# Altium footprint library Altium_Lib.PcbLib: 334 footprints (part 1 of 21)
Each footprint in its own frame and in the unit in brackets; x right, y up, seen from the top. Pads: shape width x height; smd on the part's side, far side on the other; paste and mask are expansions set on the pad; w line width, h text height; cw(c..) or ccw(c..) is an arc to the next point about the centre after c.
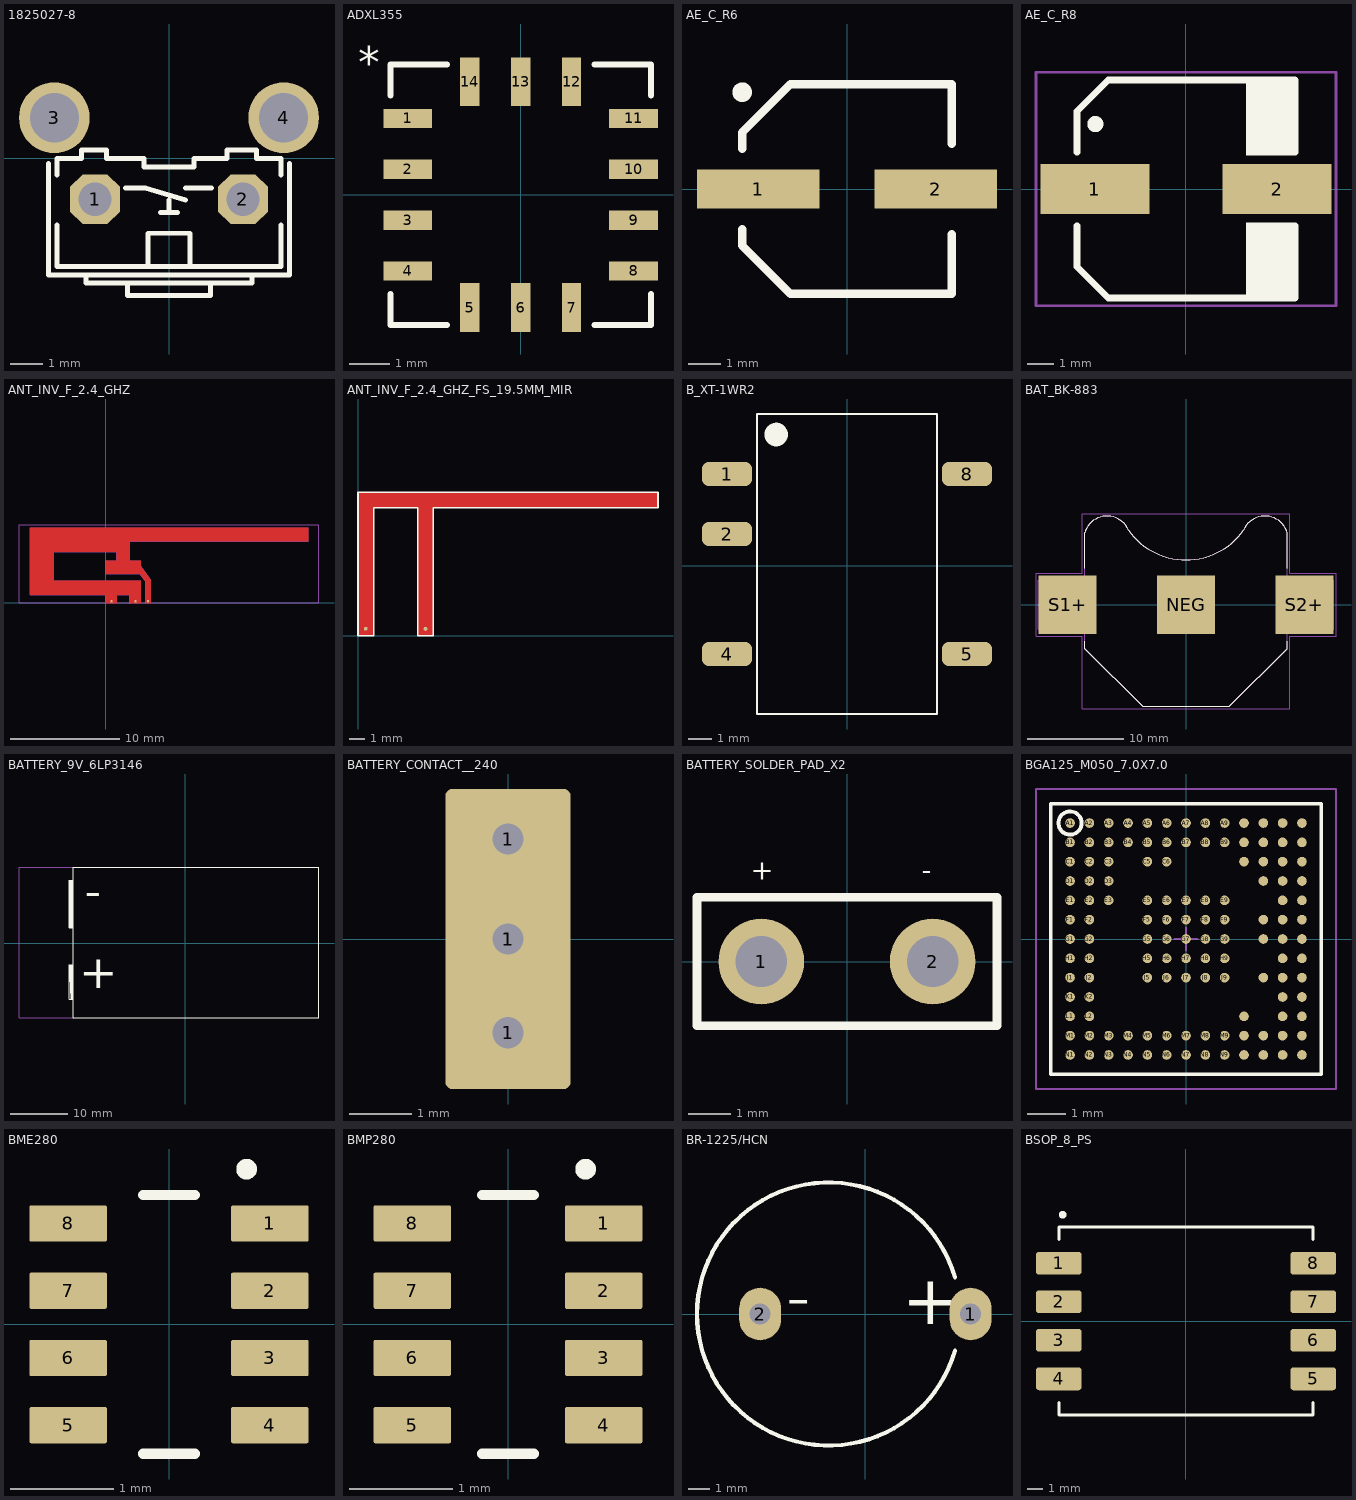
[diagram p0: the footprints below, top view; thin cyan lines are the x and y axes]

## 1825027-8 [mil] "B3F-31XX"
pads (4):
  oct 60x60 hole 40: 1(-89,-49.02) 2(89,-49.02)
  round 85 hole 59: 3(-138,49) 4(138,49)
Top Overlay:
  lines w6: -145,-5.91 -145,-140 100,-140 ; -135,-80 -135,-130 -25,-130 ; -135,-20 -135,0 -105,0 -105,10 -75,10 -75,0 -30,0 -30,-10 30,-10 30,0 70,0 70,10 105,10 105,0 135,0 135,-20 ; -100,-140 -100,-150 -50,-150 ; -52.17,-35.43 -28.54,-35.43 20,-50 ; -10,-65 0,-65 ; 0,-50 0,-65 ; 10,-65 0,-65 ; 19.68,-35.43 51.18,-35.43 ; 135,-80 135,-130 25,-130 ; 145,-5.91 145,-140 100,-140 ; -50,-150 -50,-165 50,-165 50,-150 ; -50,-150 50,-150 ; -25,-130 -25,-90 25,-90 25,-130 ; -25,-130 25,-130 ; 50,-150 100,-150 100,-140
3D body "c-1825027-8-g-3d.stp": height 314.85, standoff -99.15, extent -161.56,-278.59 169.44,108.91

## ADXL355 [mil]
pads (14):
  rect 48x19 smd: 1(-111,75) 2(-111,25) 3(-111,-25) 4(-111,-75) 8(111,-75) 9(111,-25) 10(111,25) 11(111,75)
  rect 19x48 smd: 5(-50,-111) 6(0,-111) 7(50,-111) 12(50,111) 13(0,111) 14(-50,111)
Top Overlay:
  lines w6: -128,-97.6 -128,-128 -72.6,-128 ; -128,97.6 -128,128 -72.6,128 ; 72.6,-128 128,-128 128,-97.6 ; 72.6,128 128,128 128,97.6
  text "*" at -160,115 h31.25

## AE_C_R6 [mm]
pads (2):
  rect 3.8x1.2 smd: 1(-2.75,0) 2(2.75,0)
Top Overlay:
  circle w0.305: c-3.25,3 r0.152
  lines w0.254: -3.25,-1.25 -3.25,-1.75 -1.75,-3.25 3.25,-3.25 3.25,-1.4 ; -3.25,1.25 -3.25,1.75 -1.75,3.25 3.25,3.25 3.25,1.4
3D body "User Library-SMD Polymer Aluminum Electrolytic Capacitors C6.STEP": height 5.9, standoff -0.05, extent -3.65,-3.3 3.65,3.3

## AE_C_R8 [mm]
height 10
pads (2):
  rect 4.15x1.9 smd: 1(-3.475,0) 2(3.475,0)
Top Overlay:
  circle w0.305: c-3.452,2.475 r0.152
  rectangle: 2.286,1.27 4.191,4.166
  rectangle: 2.286,-4.115 4.14,-1.27
  lines w0.254: -4.15,-1.4 -4.15,-2.962 -2.962,-4.15 4.15,-4.15 4.15,-1.4 ; -4.15,1.4 -4.15,2.962 -2.962,4.15 4.15,4.15 4.15,1.4
Mechanical 15:
  lines w0.1: -5.715,-4.445 5.715,-4.445 5.715,4.445 -5.715,4.445 -5.715,-4.445
3D body "AE_C_R8_01.STEP": height 10.2, standoff 0, extent -4.95,-4.15 4.95,4.15

## ANT_INV_F_2.4_GHZ [mm]
pads (3):
  rrect10% 0.2x0.2 smd mask+0.05: 1(3.875,0.15) 2(2.725,0.15) 3(0.525,0.15)
Top Layer:
  region: -6.98,0.735 -0.005,0.735 -0.005,0 -0.005,-0.001 -0.004,-0.003 -0.003,-0.004 -0.001,-0.005 0,-0.005 1,-0.005 1.001,-0.005 1.003,-0.004 1.005,-0.003 1.006,-0.001 1.006,0 1.006,0.735 2.195,0.735 2.195,0 2.195,-0.001 2.196,-0.003 2.197,-0.004 2.199,-0.005 2.2,-0.005 3.2,-0.005 3.201,-0.005 3.203,-0.004 3.205,-0.003 3.206,-0.001 3.206,0 3.206,2.03 3.206,2.031 3.205,2.033 3.203,2.035 3.201,2.036 3.2,2.036 -4.794,2.036 -4.794,4.695 0.995,4.695 0.995,3.906 0,3.906 -0.001,3.906 -0.003,3.905 -0.004,3.903 -0.005,3.901 -0.005,3.9 -0.005,2.69 -0.005,2.689 -0.004,2.687 -0.003,2.686 -0.001,2.685 0,2.685 3.126,2.685 3.645,1.934 3.645,0 3.645,-0.001 3.646,-0.003 3.647,-0.004 3.649,-0.005 3.65,-0.005 4.11,-0.005 4.111,-0.005 4.113,-0.004 4.115,-0.003 4.116,-0.001 4.116,0 4.116,2.078 4.116,2.079 4.115,2.079 4.115,2.08 4.115,2.081 3.206,3.4 3.206,3.9 3.206,3.901 3.205,3.903 3.203,3.905 3.201,3.906 3.2,3.906 2.206,3.906 2.206,5.695 18.6,5.695 18.601,5.695 18.603,5.696 18.605,5.697 18.606,5.699 18.606,5.7 18.606,6.91 18.606,6.911 18.605,6.913 18.603,6.915 18.601,6.916 18.6,6.916 -6.98,6.916 -6.981,6.916 -6.983,6.915 -6.984,6.913 -6.985,6.911 -6.985,6.91 -6.985,0.74 -6.985,0.739 -6.984,0.737 -6.983,0.736 -6.981,0.735
Mechanical 2:
  lines w0.01: 0,0 1,0 ; 0,0 1,0 ; 0,0 0,0.74 -6.98,0.74 -6.98,6.91 18.6,6.91 18.6,5.7 2.2,5.7 2.2,3.9 3.2,3.9 3.2,3.398 4.11,2.078 4.11,0 ; 0,0 1,0 ; 1,0 1,0.74 2.2,0.74 2.2,0 ; 2.2,0 3.2,0 ; 2.2,0 3.2,0 ; 2.2,0 3.2,0 ; 3.2,0 3.2,2.03 -4.8,2.03 -4.8,4.7 1,4.7 1,3.9 0,3.9 0,2.69 3.129,2.69 3.65,1.935 3.65,0 ; 3.65,0 4.11,0 ; 3.65,0 4.11,0 ; 3.65,0 4.11,0
Mechanical 31:
  lines w0.05: -8,0 -7,0 18.6,0 19.6,0 19.6,7.175 -8,7.175 -8,0

## ANT_INV_F_2.4_GHZ_FS_19.5MM_MIR [mil] "F-ANTENNA INVERSE 19.5 mm"
pads (2):
  round 10 smd paste-10 mask-10: 1(172.68,17.72) 2(19.68,17.85)
Top Layer:
  region: 0,367.2 767.72,367.2 767.72,327.07 193,327.07 193,0 153,0 153,327.07 40,327.07 40,0 20,0 0,0
Top Overlay:
  lines w3.94: 0,0.13 40,0.13 40,327.13 153,327.13 153,0.13 193,0.13 193,327.13 767.72,327.13 767.72,367.13 0,367.13 0,0.13

## B_XT-1WR2 [mm]
pads (5):
  rrect50% 2.1x1 smd: 1(-5.08,3.88) 2(-5.08,1.34) 4(-5.08,-3.74) 5(5.08,-3.74) 8(5.08,3.88)
Top Overlay:
  circle w0.5: c-3,5.55 r0.25
  lines w0.1: -3.81,-6.28 -3.81,6.42 3.81,6.42 3.81,-6.28 -3.81,-6.28
3D body "User Library-B_XT-1WR2.STEP": height 7.45, standoff 0.2, extent -5.6,-6.25 5.6,6.45

## BAT_BK-883 [mm]
pads (3):
  rect 6.07x6.07 smd paste-4: NEG(0,0)
  rect 6.07x6.07 smd: S1+(-12.33,0) S2+(12.33,0)
Top Overlay:
  lines w0.127: -10.561,7.48 cw(c-8.222,6.81) -6,7.799 ; -10.555,-3.81 -10.555,-4.58 -4.5,-10.57 4.5,-10.57 10.555,-4.58 10.555,-3.81 ; -10.555,3.81 -10.555,7.5 ; -6,7.8 ccw(c0,12.001) 6,7.8 ; 6,7.799 cw(c8.222,6.81) 10.561,7.48 ; 10.555,3.81 10.555,7.5
Mechanical 13:
  lines w0.127: -10.561,7.48 cw(c-8.222,6.81) -6,7.799 ; -10.555,7.5 -10.555,2.54 -15.365,2.54 -15.365,-2.54 -10.555,-2.54 -10.555,-4.58 -4.5,-10.57 4.5,-10.57 10.555,-4.58 10.555,-2.54 15.365,-2.54 15.365,2.54 10.555,2.54 10.555,7.5 ; -6,7.8 ccw(c0,12.001) 6,7.8 ; 6,7.799 cw(c8.222,6.81) 10.561,7.48
Mechanical 15:
  lines w0.05: -15.615,-3.285 -10.805,-3.285 -10.805,-10.82 10.805,-10.82 10.805,-3.285 15.615,-3.285 15.615,3.285 10.805,3.285 10.805,9.49 -10.805,9.49 -10.805,3.285 -15.615,3.285 -15.615,-3.285
3D body "step_temp.STEP": height 3.96, standoff 0, extent -15.23,-9.405 15.5,10.405
3D body "2032 Battery.STEP": height 3.2, standoff 0, extent -10,-10.75 10,9.25

## BATTERY_9V_6LP3146 [mm]
Top Overlay:
  region: -19.5,11 -20.25,11 -20.25,2.75 -19.5,2.75
  region: -19.5,-9.75 -20,-9.75 -20.25,-3.75 -19.5,-3.75
  lines w0.2: -19.5,-9.75 -20.25,-9.75 -20.25,-3.75 -19.5,-3.75 ; -19.5,2.75 -20.25,2.75 -20.25,11 -19.5,11 ; -19.5,-13 23.375,-13 23.375,13.25 -19.5,13.25 -19.5,-13
  text "+" at -18.5,-9.75 h10
  text "-" at -17.5,4.5 h10
Mechanical 21:
  lines w0.2: -19.5,-13 -29,-13 -29,13.25 -23.25,13.25 -19.5,13.25
3D body "User Library-9V Duracell Battery.STEP": height 17.3, standoff 0.7, extent -23.35,-12.75 23.16,13.25

## BATTERY_CONTACT__240 [mm]
pads (4):
  round 1 hole 0.5: 1(0,-1.5) 1(0,0) 1(0,1.6)
  rrect10% 2x4.8 smd: 1(0,0)
3D body "keystone-PN240.STEP": height 4.66, standoff -4.07, extent -4.35,-10.3 4.287,1.3

## BATTERY_SOLDER_PAD_X2 [mm]
pads (2):
  round 2 hole 1.2: 1(-2,0) 2(2,0)
Top Overlay:
  lines w0.2: -3.5,-1.5 3.5,-1.5 3.5,1.5 -3.5,1.5 -3.5,-1.5
  text "-" at 1.75,1.75 h0.8
  text "+" at -2.25,1.75 h0.8

## BGA125_M050_7.0X7.0 [mm] "(BGA125N7X7P0.5)"
height 1
pads (125):
  round 0.25 smd: A1(-3,3) A2(-2.5,3) A3(-2,3) A4(-1.5,3) A5(-1,3) A6(-0.5,3) A7(0,3) A8(0.5,3) A9(1,3) A10(1.5,3) A11(2,3) A12(2.5,3) A13(3,3) B1(-3,2.5) B2(-2.5,2.5) B3(-2,2.5) B4(-1.5,2.5) B5(-1,2.5) B6(-0.5,2.5) B7(0,2.5) B8(0.5,2.5) B9(1,2.5) B10(1.5,2.5) B11(2,2.5) B12(2.5,2.5) B13(3,2.5) C1(-3,2) C2(-2.5,2) C3(-2,2) C5(-1,2) C6(-0.5,2) C10(1.5,2) C11(2,2) C12(2.5,2) C13(3,2) D1(-3,1.5) D2(-2.5,1.5) D3(-2,1.5) D11(2,1.5) D12(2.5,1.5) D13(3,1.5) E1(-3,1) E2(-2.5,1) E3(-2,1) E5(-1,1) E6(-0.5,1) E7(0,1) E8(0.5,1) E9(1,1) E12(2.5,1) E13(3,1) F1(-3,0.5) F2(-2.5,0.5) F5(-1,0.5) F6(-0.5,0.5) F7(0,0.5) F8(0.5,0.5) F9(1,0.5) F11(2,0.5) F12(2.5,0.5) F13(3,0.5) G1(-3,0) G2(-2.5,0) G5(-1,0) G6(-0.5,0) G7(0,0) G8(0.5,0) G9(1,0) G11(2,0) G12(2.5,0) G13(3,0) H1(-3,-0.5) H2(-2.5,-0.5) H5(-1,-0.5) H6(-0.5,-0.5) H7(0,-0.5) H8(0.5,-0.5) H9(1,-0.5) H12(2.5,-0.5) H13(3,-0.5) J1(-3,-1) J2(-2.5,-1) J5(-1,-1) J6(-0.5,-1) J7(0,-1) J8(0.5,-1) J9(1,-1) J11(2,-1) J12(2.5,-1) J13(3,-1) K1(-3,-1.5) K2(-2.5,-1.5) K12(2.5,-1.5) K13(3,-1.5) L1(-3,-2) L2(-2.5,-2) L10(1.5,-2) L12(2.5,-2) L13(3,-2) M1(-3,-2.5) M2(-2.5,-2.5) M3(-2,-2.5) M4(-1.5,-2.5) M5(-1,-2.5) M6(-0.5,-2.5) M7(0,-2.5) M8(0.5,-2.5) M9(1,-2.5) M10(1.5,-2.5) M11(2,-2.5) M12(2.5,-2.5) M13(3,-2.5) N1(-3,-3) N2(-2.5,-3) N3(-2,-3) N4(-1.5,-3) N5(-1,-3) N6(-0.5,-3) N7(0,-3) N8(0.5,-3) N9(1,-3) N10(1.5,-3) N11(2,-3) N12(2.5,-3) N13(3,-3)
Top Overlay:
  circle w0.1: c-3,3 r0.3
  lines w0.1: -3.5,-3.5 3.5,-3.5 3.5,3.5 -3.5,3.5 -3.5,-3.5
Mechanical 15:
  lines w0.05: -0.3,0 0.3,0 ; 0,-0.3 0,0.3 ; -3.881,-3.881 3.881,-3.881 3.881,3.881 -3.881,3.881 -3.881,-3.881
3D body: height 1, standoff 0, extent -3.5,-3.5 3.5,3.5
3D body: height 1.01, standoff 0, extent -3.299,2.701 -2.701,3.299

## BME280 [mm]
pads (8):
  rrect10% 0.75x0.35 smd mask+0.05: 1(0.975,0.975) 2(0.975,0.325) 3(0.975,-0.325) 4(0.975,-0.975) 5(-0.975,-0.975) 6(-0.975,-0.325) 7(-0.975,0.325) 8(-0.975,0.975)
Top Overlay:
  circle w0.1: c0.75,1.5 r0.05
  lines w0.1: -0.25,-1.25 0.25,-1.25 ; -0.25,1.25 0.25,1.25
3D body "User Library-Bosch_BME280.STEP": height 0.93, standoff 0, extent -1.25,-1.25 1.25,1.25

## BMP280 [mm]
pads (8):
  rrect10% 0.75x0.35 smd mask+0.05: 1(0.925,0.975) 2(0.925,0.325) 3(0.925,-0.325) 4(0.925,-0.975) 5(-0.925,-0.975) 6(-0.925,-0.325) 7(-0.925,0.325) 8(-0.925,0.975)
Top Overlay:
  circle w0.1: c0.75,1.5 r0.05
  lines w0.1: -0.25,-1.25 0.25,-1.25 ; -0.25,1.25 0.25,1.25
3D body "User Library-BST-BMP280.STEP": height 1, standoff 0, extent -1,-1.25 1,1.25

## BR-1225/HCN [mm]
pads (2):
  oval 2x2.5 hole 1: 1(5,0) 2(-5,0)
Top Overlay:
  lines w0.2: 4.25,-1.75 cw(c-1.75,0) 4.25,1.75
  text "-" at -3.75,-1 h4
  text "+" at 1.75,-1.25 h4
3D body "User Library-BR-1225A.STEP": height 4.75, standoff -3.45, extent -8.05,-6.3 4.95,6.3

## BSOP_8_PS [mm] "8-BSOP (0.475\", 12.06mm Width) Dual Ports, Same Side"
height 9.4
pads (8):
  rrect25% 3x1.5 smd: 1(-8.38,3.81) 2(-8.38,1.27) 3(-8.38,-1.27) 4(-8.38,-3.81) 5(8.38,-3.81) 6(8.38,-1.27) 7(8.38,1.27) 8(8.38,3.81)
Top Overlay:
  circle w0.25: c-8.125,7 r0.125
  lines w0.2: -8.38,-5.38 -8.38,-6.2 8.38,-6.2 8.38,-5.38 ; -8.38,5.38 -8.38,6.2 8.38,6.2 8.38,5.38
3D body "MPXV5004DP.STEP": height 10.57, standoff -0.32, extent -8.793,-6.035 8.793,12.385